# Altium footprint library BARKO_PCBLIB.PcbLib: 531 footprints (part 19 of 34)
Each footprint in its own frame and in the unit in brackets; x right, y up, seen from the top. Pads: shape width x height; smd on the part's side, far side on the other; paste and mask are expansions set on the pad; w line width, h text height; cw(c..) or ccw(c..) is an arc to the next point about the centre after c.
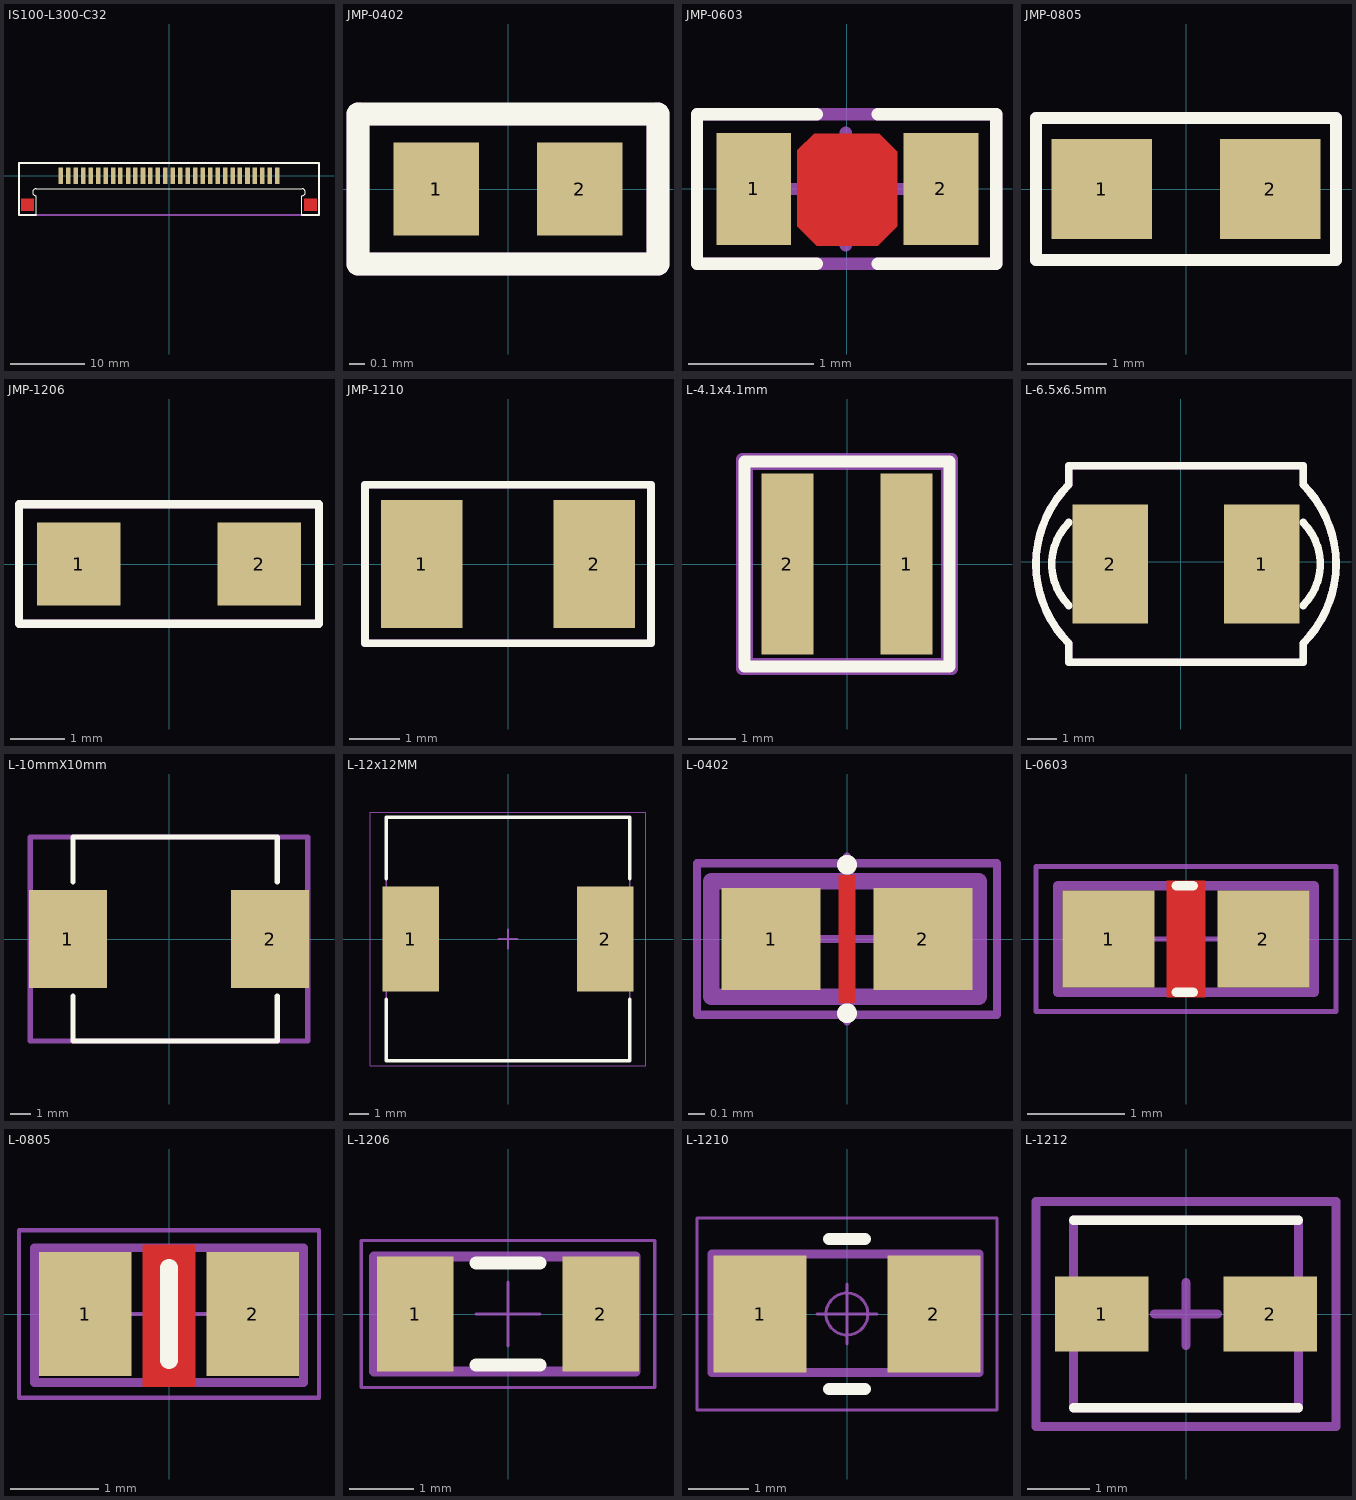
[diagram p18: the footprints below, top view; thin cyan lines are the x and y axes]

## IS100-L300-C32 [mil]
pads (32):
  rect 24x87 smd mask+2: 1(-571,0) 2(-531,0) 3(-492,0) 4(-452,0) 5(-452,0) 6(-413,0) 7(-374,0) 8(-334,0) 9(-295,0) 10(-256,0) 11(-216,0) 12(-177,0) 13(-137,0) 14(-98,0) 15(-59,0) 16(-19,0) 17(20,0) 18(59,0) 19(99,0) 20(138,0) 21(177,0) 22(217,0) 23(217,0) 24(256,0) 25(296,0) 26(335,0) 27(374,0) 28(414,0) 29(453,0) 30(492,0) 31(532,0) 32(571,0)
Top Layer:
  rectangle: 712,-186 780,-118
  rectangle: -780,-186 -712,-118
Top Overlay:
  lines w0.1: -700,-207 -700,-105 cw(c-700,-86) -700,-67 ; -699.91,-67.09 701.89,-67.09 cw(c700,-86) 700,-105 700,-207
  lines w10: -700,-207 -791,-207 -791,69 791,69 791,-207 714,-207 700,-207
Top Solder:
  rectangle: 710,-188 782,-116
  rectangle: -782,-188 -710,-116
ASM Top:
  lines w10: -791,-207 -791,69 791,69 791,-207 -791,-207
  text ".designator" at -331,-124 h31.5

## JMP-0402 [mm]
pads (3):
  rect 0.57x0.62 smd mask+0.05: 1(-0.48,0) 2(0.48,0)
  rect 0.57x0.62 smd mask+0: 1(-0.48,0)
Top Overlay:
  lines w0.152: -1,-0.5 -1,0.5 1,0.5 1,-0.5 -1,-0.5
ASM Top:
  lines w0.15: -1,0.5 1,0.5
  lines w0.152: -1,0.5 -1,-0.5 1,-0.5 1,0.5
  text ".designator" at -0.011,-0.078 h0.8
3D body "R_0402.step": height 0.41, standoff 0.01, extent -0.546,-0.275 0.524,0.275

## JMP-0603 [mm]
pads (2):
  rect 0.6x0.9 smd: 1(-0.744,0) 2(0.756,0)
Top Layer:
  pour cut-out: -0.262,0.444 -0.394,0.311 -0.394,-0.3 -0.238,-0.456 0.249,-0.456 0.406,-0.3 0.406,0.3 0.262,0.444
Top Overlay:
  lines w0.1: -0.238,-0.6 -1.2,-0.6 -1.2,0.6 -0.238,0.6 ; 0.249,-0.6 1.2,-0.6 1.2,0.6 0.249,0.6
Mechanical 15:
  lines w0.1: -0.45,0 0.45,0 ; -0.006,-0.45 -0.006,0.45
ASM Top:
  lines w0.1: -1.2,-0.6 -1.2,0.6 1.2,0.6 1.2,-0.6 -1.2,-0.6
  text ".designator" at -0.33,-0.178 h0.8
3D body: height 0.25, standoff 0, extent 0.025,0.229 0.025,0.229
3D body "R_0603.step": height 0.46, standoff 0.01, extent -0.775,-0.425 0.775,0.425

## JMP-0805 [mil]
pads (2):
  rect 50x50 smd mask+1.97: 1(-42,0) 2(42,0)
Top Overlay:
  lines w6: -74.8,-35.43 74.8,-35.43 74.8,35.43 -74.8,35.43 -74.8,-35.43
ASM Top:
  lines w6: -74.8,-35.43 -74.8,35.43 74.8,35.43 74.8,-35.43 -74.8,-35.43
  text ".designator" at -61,-19 h31.5
3D body "R_0805.step": height 20.18, standoff 0.5, extent -40.36,-24.6 38.38,24.61

## JMP-1206 [mil]
pads (2):
  rect 60x60 smd mask+0: 1(-65,0) 2(65,0)
Top Overlay:
  lines w6: -108,-43 -108,43 108,43 108,-43 -108,-43
Top 3D Body:
  lines w6: -108,42 -108,-43 108,-43 108,43 -108,43
ASM Top:
  lines w6: -108,-43 -108,43 108,43 108,-43 -108,-43
  text ".designator" at -88,-22 h31.5
3D body "R_1206.step": height 22.15, standoff 0.5, extent -57.99,-31.49 68,31.5

## JMP-1210 [mil]
pads (2):
  rect 64x100 smd mask+0: 1(-67.5,0) 2(67.5,0)
Top Overlay:
  lines w6: -112,-62 -112,62 112,62 112,-62 -112,-62
ASM Top:
  lines w6: -112,-62 -112,62 112,62 112,-62 -112,-62
  text ".designator" at -95,-45 h31.5
3D body "R_1210.step": height 22.16, standoff 0.5, extent -62.99,-49.42 63,49

## L-4.1x4.1mm [mm] "SRP4020FA-2R2M"
height 2.1
pads (2):
  rect 1.1x3.8 smd mask+0.05: 1(1.25,0) 2(-1.25,0)
Top Overlay:
  lines w0.254: -2.15,-2.15 -2.15,2.15 2.15,2.15 2.15,-2.15 -2.15,-2.15
Mechanical 15:
  lines w0.254: -2.2,-2.2 2.2,-2.2 2.2,2.2 -2.1,2.2 -2.2,2.2 -2.2,-2.2
ASM Top:
  lines w0.254: -2.1,-2.1 -2.1,2.1 2.1,2.1 2.1,-2.1 -2.1,-2.1
  text ".designator" at -1.6,-0.4 h0.8
3D body "SRP4020FA.stp": height 1.91, standoff 0, extent -2.05,-2.05 2.05,2.05

## L-6.5x6.5mm [mil]
pads (2):
  rect 100x158 smd mask+1.97: 1(107,-3) 2(-93,-3)
Top Overlay:
  lines w10: -148,-58 cw(c-93,-3) -148,52 ; 162,-58 ccw(c107,-3) 162,52 ; -148,-133 -148,-108 cw(c-43,-3) -148,102 -148,127 162,127 162,102 cw(c57,-3) 162,-108 162,-133 -148,-133
ASM Top:
  lines w10: -148,-133 -148,-108 cw(c-43,-3) -148,102 -148,127 162,127 162,102 cw(c57,-3) 162,-108 162,-133 -148,-133
  text ".designator" at -43,-7.94 h31.5
3D body "srr0603.stp": height 130.42, standoff 0.5, extent -120.9,-130 135,125.9

## L-10mmX10mm [mm]
height 4.5
pads (2):
  rect 3.8x4.8 smd: 1(-4.95,0) 2(4.95,0)
Top Overlay:
  lines w0.254: -4.7,-2.8 -4.7,-5 5.3,-5 5.3,-2.8 ; -4.7,2.8 -4.7,5 5.3,5 5.3,2.8
ASM Top:
  lines w0.254: -6.8,-4.962 -6.762,-5 6.8,-5 6.8,5 -6.8,5 -6.8,-5 -6.8,-4.924
  text ".designator" at -1,-0.3 h0.8
3D body "7447714015_Download_STP_WE-PD-1050_rev1.stp": height 4.76, standoff -0.04, extent -4.7,-5 5.3,5

## L-12x12MM [mm] "Precision Wire Wound Inductor, 2-Leads, Body 12.00x12.00mm, IPC Medium Density"
height 6
pads (2):
  rect 2.9x5.4 smd: 1(-5,0) 2(5,0)
Top Overlay:
  lines w0.2: -6.25,-3.1 -6.25,-6.25 6.25,-6.25 6.25,-3.1 ; -6.25,3.1 -6.25,6.25 6.25,6.25 6.25,3.1
Mechanical 15:
  lines w0.05: -7.075,-6.5 -7.075,6.5 7.075,6.5 7.075,-6.5 -7.075,-6.5
  lines w0.1: -0.5,0 0.5,0 ; 0,-0.5 0,0.5
ASM Top:
  lines w0.1: -6.25,-6.25 -6.25,6.25 6.25,6.25 6.25,-6.25 -6.25,-6.25
  text ".designator" at -1.662,-0.2 h0.8
3D body "L-12x12MM.step": height 6.1, standoff 0, extent -6.1,-6 6.1,6

## L-0402 [mm]
pads (2):
  rect 0.6x0.62 smd: 1(-0.46,0) 2(0.46,0)
Top Layer:
  pour cut-out: -0.05,0.388 -0.05,-0.387 0.05,-0.388 0.05,0.387
Top Overlay:
  circle w0.1: c0,-0.45 r0.01
  circle w0.1: c0,0.45 r0.01
Mechanical 15:
  lines w0.05: -0.5,0 0.5,0 ; 0,-0.5 0,0.5 ; -0.91,-0.46 0.91,-0.46 0.91,0.46 -0.91,0.46 -0.91,-0.46
ASM Top:
  lines w0.1: -0.825,-0.35 0.8,-0.35 0.8,0.35 -0.825,0.35 -0.825,-0.35
  text ".designator" at -0.5,-0.2 h0.8
3D body "INDC1005X60N EIA 0402.step": height 0.51, standoff 0.01, extent -0.475,-0.305 0.525,0.295

## L-0603 [mm]
pads (2):
  rect 0.95x1 smd: 1(-0.8,0) 2(0.8,0)
Top Layer:
  pour cut-out: -0.2,0.6 -0.2,-0.6 0.2,-0.6 0.2,0.6
Top Overlay:
  lines w0.1: -0.1,-0.55 0.075,-0.55 ; -0.1,0.55 0.075,0.55
Top Paste:
  region: 0.356,0.33 1.118,0.33 1.118,0.102 0.356,0.102
  region: 0.356,-0.025 1.118,-0.025 1.118,-0.254 0.356,-0.254
Mechanical 15:
  lines w0.05: -0.5,0 0.5,0 ; 0,-0.5 0,0.5 ; -1.55,-0.75 -1.55,0.75 1.55,0.75 1.55,-0.75 -1.55,-0.75
ASM Top:
  lines w0.1: -1.325,-0.55 1.325,-0.55 1.325,0.55 -1.325,0.55 -1.325,-0.55
  text ".designator" at -0.6,-0.2 h0.8
3D body "INDC1608X95N EIA 0603.step": height 0.81, standoff 0.01, extent -0.8,-0.482 0.8,0.468

## L-0805 [mm]
pads (2):
  rect 1.05x1.4 smd: 1(-0.95,0) 2(0.95,0)
Top Layer:
  pour cut-out: -0.3,0.788 -0.3,-0.825 0.3,-0.825 0.3,0.787
Top Overlay:
  lines w0.2: 0,-0.525 0,0.525
Mechanical 15:
  lines w0.05: -0.5,0 0.5,0 ; 0,-0.5 0,0.5 ; -1.7,-0.95 1.7,-0.95 1.7,0.95 -1.7,0.95 -1.7,-0.95
ASM Top:
  lines w0.1: -1.525,-0.775 1.525,-0.775 1.525,0.75 -1.525,0.75 -1.525,-0.775
  text ".designator" at -1.397,-0.483 h0.8
3D body "INDC2012X95N EIA 0805.step": height 0.96, standoff 0.01, extent -1,-0.61 1,0.59

## L-1206 [mm]
pads (2):
  rect 1.2x1.8 smd: 1(-1.45,0) 2(1.45,0)
Top Overlay:
  lines w0.2: -0.5,-0.8 0.5,-0.8 ; -0.5,0.8 0.5,0.8
Mechanical 15:
  lines w0.05: -0.5,0 0.5,0 ; 0,-0.5 0,0.5 ; -2.3,-1.15 -2.3,1.15 2.3,1.15 2.3,-1.15 -2.3,-1.15
ASM Top:
  lines w0.152: -2.1,-0.9 -2.1,0.9 2,0.9 2,-0.9 -2.1,-0.9
  text ".designator" at -0.7,-0.2 h0.8
3D body "INDC3216X130N EIA 1206.step": height 1.31, standoff 0.01, extent -1.6,-0.8 1.6,0.8

## L-1210 [mm]
pads (2):
  rect 1.55x1.95 smd: 1(-1.45,0) 2(1.45,0)
Top Overlay:
  lines w0.2: -0.3,-1.25 0.3,-1.25 ; -0.3,1.25 0.3,1.25
Mechanical 15:
  circle w0.05: c0,0 r0.35
  lines w0.05: -0.5,0 0.5,0 ; 0,-0.5 0,0.5 ; -2.5,-1.6 2.5,-1.6 2.5,1.6 -2.5,1.6 -2.5,-1.6
ASM Top:
  lines w0.152: -2.25,-0.975 2.2,-0.975 2.2,1 -2.25,1 -2.25,-0.975
  text ".designator" at -0.8,-0.3 h0.8
3D body "INDC3225X135N EIA 1210.step": height 1.36, standoff 0.01, extent -1.6,-1.245 1.6,1.255

## L-1212 [mm]
height 2
pads (2):
  rect 1.5x1.2 smd: 1(-1.35,0) 2(1.35,0)
Top Overlay:
  lines w0.15: -1.8,-1.5 1.8,-1.5 ; -1.8,1.5 1.8,1.5
Mechanical 15:
  lines w0.15: -0.5,0 0.5,0 ; 0,-0.5 0,0.5 ; -2.4,-1.8 2.4,-1.8 2.4,1.8 -2.4,1.8 -2.4,-1.8
ASM Top:
  lines w0.15: -1.8,-1.5 1.8,-1.5 1.8,1.5 -1.8,1.5 -1.8,-1.5
  text ".designator" at -0.6,-0.2 h1.5
3D body "IHLP1212BZER2R2M11.stp": height 2, standoff 0, extent -1.825,-1.5 1.825,1.5